# Altium footprint library LukaLIBRARY.PcbLib: 772 footprints (part 34 of 49)
Each footprint in its own frame and in the unit in brackets; x right, y up, seen from the top. Pads: shape width x height; smd on the part's side, far side on the other; paste and mask are expansions set on the pad; w line width, h text height; cw(c..) or ccw(c..) is an arc to the next point about the centre after c.
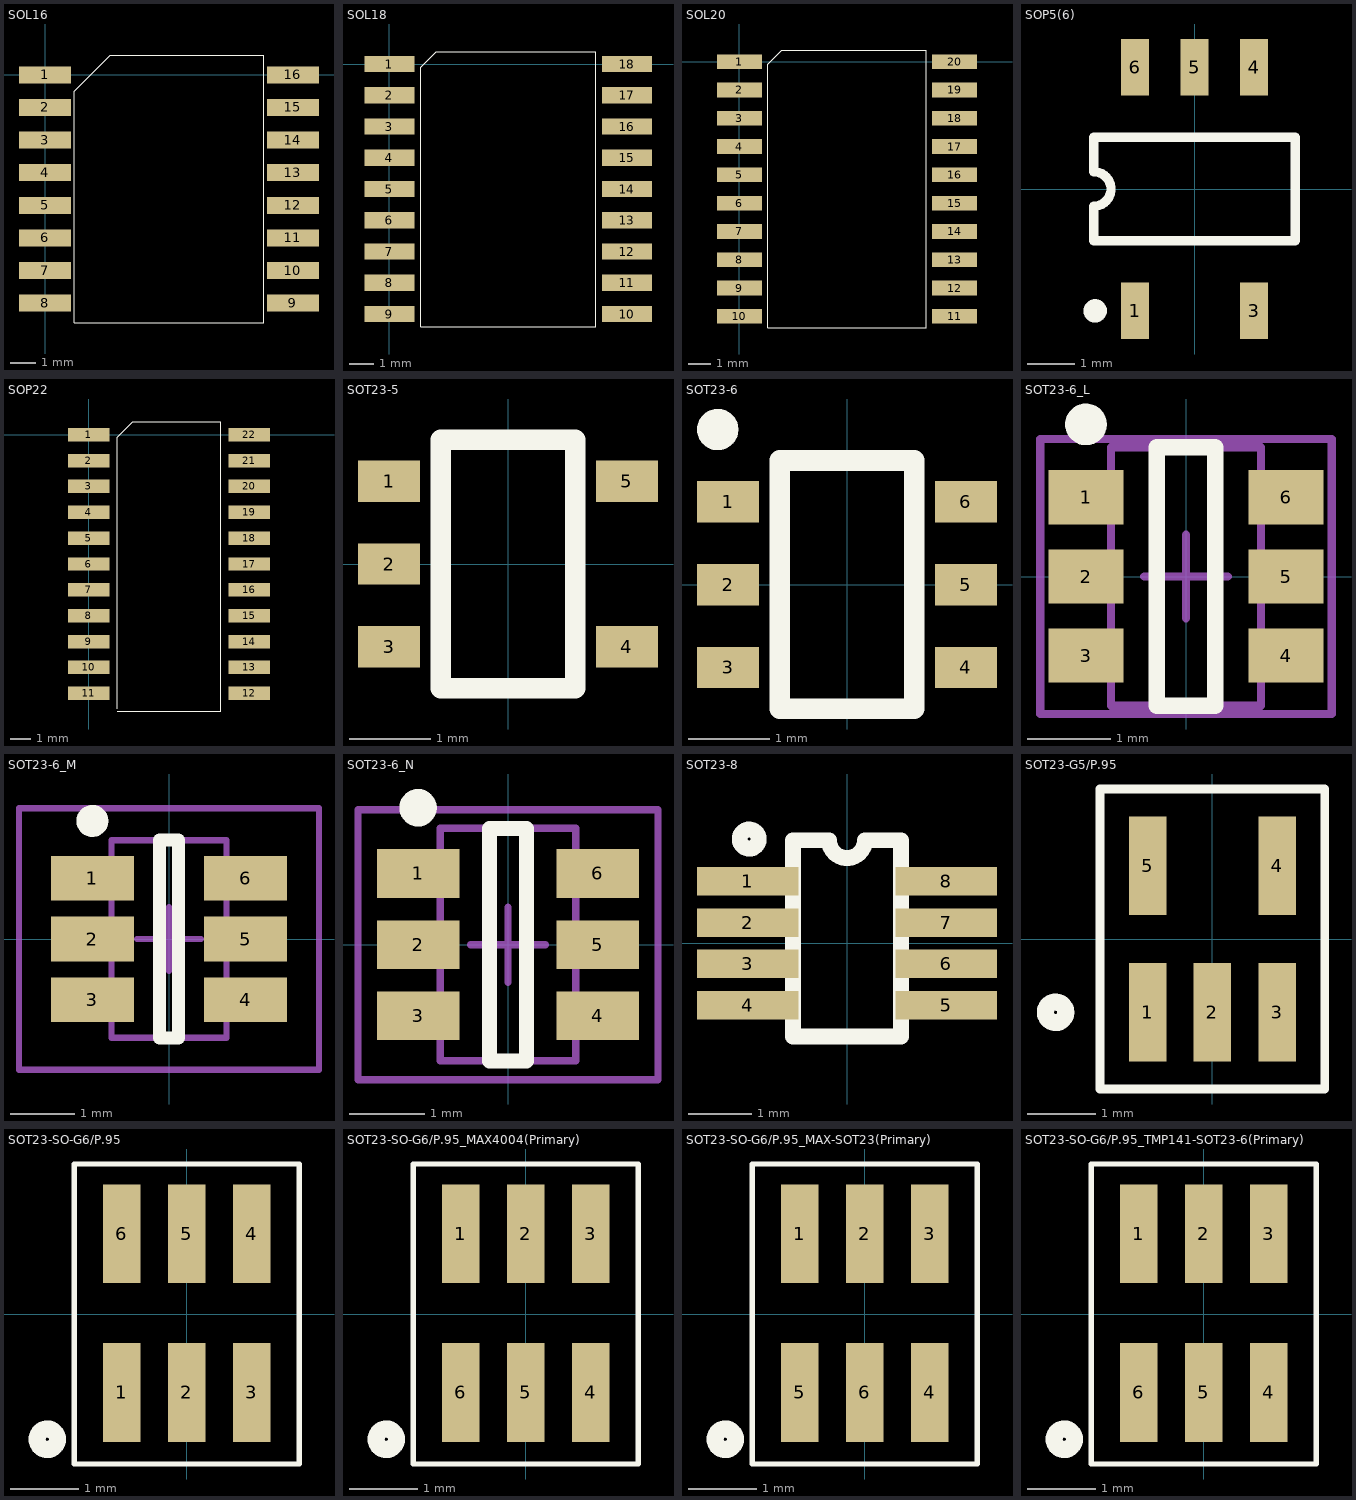
[diagram p33: the footprints below, top view; thin cyan lines are the x and y axes]

## SOL16 [mil]
pads (16):
  rect 80x26 smd mask-1000: 1(0,0) 2(0,-50) 3(0,-100) 4(0,-150) 5(0,-200) 6(0,-250) 7(0,-300) 8(0,-350) 9(380,-350) 10(380,-300) 11(380,-250) 12(380,-200) 13(380,-150) 14(380,-100) 15(380,-50) 16(380,0)
Top Overlay:
  lines w1: 45,-380 45,-25 100,30 335,30 335,-380 45,-380
Top Solder:
  region: -40,-263 40,-263 40,-237 -40,-237
  region: -40,-313 40,-313 40,-287 -40,-287
  region: -40,-363 40,-363 40,-337 -40,-337
  region: -40,-13 40,-13 40,13 -40,13
  region: -40,-63 40,-63 40,-37 -40,-37
  region: -40,-113 40,-113 40,-87 -40,-87
  region: -40,-163 40,-163 40,-137 -40,-137
  region: 340,-363 420,-363 420,-337 340,-337
  region: 340,-313 420,-313 420,-287 340,-287
  region: 340,-263 420,-263 420,-237 340,-237
  region: 340,-163 420,-163 420,-137 340,-137
  region: 340,-113 420,-113 420,-87 340,-87
  region: 340,-63 420,-63 420,-37 340,-37
  region: 340,-13 420,-13 420,13 340,13
  region: -40,-213 40,-213 40,-187 -40,-187
  region: 340,-213 420,-213 420,-187 340,-187

## SOL18 [mil]
pads (18):
  rect 80x26 smd mask-1000: 1(0,0) 2(0,-50) 3(0,-100) 4(0,-150) 5(0,-200) 6(0,-250) 7(0,-300) 8(0,-350) 9(0,-400) 10(380,-400) 11(380,-350) 12(380,-300) 13(380,-250) 14(380,-200) 15(380,-150) 16(380,-100) 17(380,-50) 18(380,0)
Top Overlay:
  lines w1: 50,-420 50,-5 75,20 330,20 330,-420 50,-420
Top Solder:
  region: -40,-263 40,-263 40,-237 -40,-237
  region: -40,-313 40,-313 40,-287 -40,-287
  region: -40,-363 40,-363 40,-337 -40,-337
  region: -40,-413 40,-413 40,-387 -40,-387
  region: -40,-13 40,-13 40,13 -40,13
  region: -40,-63 40,-63 40,-37 -40,-37
  region: -40,-113 40,-113 40,-87 -40,-87
  region: -40,-163 40,-163 40,-137 -40,-137
  region: 340,-413 420,-413 420,-387 340,-387
  region: 340,-363 420,-363 420,-337 340,-337
  region: 340,-313 420,-313 420,-287 340,-287
  region: 340,-263 420,-263 420,-237 340,-237
  region: 340,-163 420,-163 420,-137 340,-137
  region: 340,-113 420,-113 420,-87 340,-87
  region: 340,-63 420,-63 420,-37 340,-37
  region: 340,-13 420,-13 420,13 340,13
  region: -40,-213 40,-213 40,-187 -40,-187
  region: 340,-213 420,-213 420,-187 340,-187

## SOL20 [mil]
pads (20):
  rect 80x26 smd mask-1000: 1(0,0) 2(0,-50) 3(0,-100) 4(0,-150) 5(0,-200) 6(0,-250) 7(0,-300) 8(0,-350) 9(0,-400) 10(0,-450) 11(380,-450) 12(380,-400) 13(380,-350) 14(380,-300) 15(380,-250) 16(380,-200) 17(380,-150) 18(380,-100) 19(380,-50) 20(380,0)
Top Overlay:
  lines w1: 50,-470 50,-5 75,20 330,20 330,-470 50,-470
Top Solder:
  region: -40,-263 40,-263 40,-237 -40,-237
  region: -40,-313 40,-313 40,-287 -40,-287
  region: -40,-363 40,-363 40,-337 -40,-337
  region: -40,-413 40,-413 40,-387 -40,-387
  region: -40,-463 40,-463 40,-437 -40,-437
  region: -40,-13 40,-13 40,13 -40,13
  region: -40,-63 40,-63 40,-37 -40,-37
  region: -40,-113 40,-113 40,-87 -40,-87
  region: -40,-163 40,-163 40,-137 -40,-137
  region: 340,-463 420,-463 420,-437 340,-437
  region: 340,-413 420,-413 420,-387 340,-387
  region: 340,-363 420,-363 420,-337 340,-337
  region: 340,-313 420,-313 420,-287 340,-287
  region: 340,-263 420,-263 420,-237 340,-237
  region: 340,-163 420,-163 420,-137 340,-137
  region: 340,-113 420,-113 420,-87 340,-87
  region: 340,-63 420,-63 420,-37 340,-37
  region: 340,-13 420,-13 420,13 340,13
  region: -40,-213 40,-213 40,-187 -40,-187
  region: 340,-213 420,-213 420,-187 340,-187

## SOP5(6) [mm] "Small Outline; 6 Leads (1 Absent); Body Width 4.4 mm; Pitch 1.27 mm"
height 2.4
pads (5):
  rect 0.6x1.2 smd: 1(-1.27,-2.6) 3(1.27,-2.6) 4(1.27,2.6) 5(0,2.6) 6(-1.27,2.6)
Top Overlay:
  circle w0.25: c-2.12,-2.6 r0.125
  lines w0.2: -2.15,-1.1 2.15,-1.1 2.15,1.1 -2.15,1.1 -2.15,0.367 cw(c-2.15,0) -2.15,-0.367 -2.15,-1.1

## SOP22 [mil]
pads (22):
  rect 80x26 smd mask-1000: 1(0,0) 2(0,-50) 3(0,-100) 4(0,-150) 5(0,-200) 6(0,-250) 7(0,-300) 8(0,-350) 9(0,-400) 10(0,-450) 11(0,-500) 12(310,-500) 13(310,-450) 14(310,-400) 15(310,-350) 16(310,-300) 17(310,-250) 18(310,-200) 19(310,-150) 20(310,-100) 21(310,-50) 22(310,0)
Top Overlay:
  lines w1: 55,-535 255,-535 255,25 85,25 55,-5 55,-530
Top Solder:
  region: -40,-363 40,-363 40,-337 -40,-337
  region: -40,-413 40,-413 40,-387 -40,-387
  region: -40,-463 40,-463 40,-437 -40,-437
  region: 40,-487 -40,-487 -40,-513 40,-513
  region: -40,-63 40,-63 40,-37 -40,-37
  region: -40,-113 40,-113 40,-87 -40,-87
  region: -40,-163 40,-163 40,-137 -40,-137
  region: -40,-213 40,-213 40,-187 -40,-187
  region: -40,-263 40,-263 40,-237 -40,-237
  region: 350,-387 270,-387 270,-413 350,-413
  region: 350,-487 270,-487 270,-513 350,-513
  region: 350,-437 270,-437 270,-463 350,-463
  region: 270,-363 350,-363 350,-337 270,-337
  region: 270,-213 350,-213 350,-187 270,-187
  region: 270,-163 350,-163 350,-137 270,-137
  region: 270,-113 350,-113 350,-87 270,-87
  region: 270,-63 350,-63 350,-37 270,-37
  region: 270,-263 350,-263 350,-237 270,-237
  region: -40,-313 40,-313 40,-287 -40,-287
  region: -40,-13 40,-13 40,13 -40,13
  region: 270,-313 350,-313 350,-287 270,-287
  region: 270,-13 350,-13 350,13 270,13

## SOT23-5 [mil]
pads (5):
  rect 30x20 smd: 1(-57.5,40) 2(-57.5,0) 3(-57.5,-40) 4(57.5,-40) 5(57.5,40)
Top Overlay:
  lines w10: -32.5,-60 32.5,-60 32.5,60 -32.5,60 -32.5,-60

## SOT23-6 [mil]
pads (6):
  rect 30x20 smd: 1(-57.5,40) 2(-57.5,0) 3(-57.5,-40) 4(57.5,-40) 5(57.5,0) 6(57.5,40)
Top Overlay:
  circle w10: c-62.5,75 r5
  lines w10: -32.5,-60 32.5,-60 32.5,60 -32.5,60 -32.5,-60

## SOT23-6_L [mm] "SOT23, 6-Leads, Body 2.9x1.6mm, Pitch 0.95mm, Lead Span 2.7mm, IPC High Density"
height 1.45
pads (6):
  rect 0.9x0.65 smd: 1(-1.2,0.95) 2(-1.2,0) 3(-1.2,-0.95) 4(1.2,-0.95) 5(1.2,0) 6(1.2,0.95)
Top Overlay:
  circle w0.25: c-1.2,1.825 r0.125
  lines w0.2: -0.35,-1.55 -0.35,1.55 0.35,1.55 0.35,-1.55 -0.35,-1.55
Mechanical 13:
  lines w0.1: -0.9,-1.55 0.9,-1.55 0.9,1.55 -0.9,1.55 -0.9,-1.55
Mechanical 15:
  lines w0.1: -0.5,0 0.5,0 ; 0,-0.5 0,0.5 ; -1.75,-1.65 1.75,-1.65 1.75,1.65 -1.75,1.65 -1.75,-1.65
3D body: height 1.45, standoff 0, extent -0.9,-1.55 0.9,1.55

## SOT23-6_M [mm] "SOT23, 6-Leads, Body 2.9x1.6mm, Pitch 0.95mm, Lead Span 2.7mm, IPC Low Density"
height 1.45
pads (6):
  rect 1.3x0.7 smd: 1(-1.2,0.95) 2(-1.2,0) 3(-1.2,-0.95) 4(1.2,-0.95) 5(1.2,0) 6(1.2,0.95)
Top Overlay:
  circle w0.25: c-1.2,1.85 r0.125
  lines w0.2: -0.15,-1.55 0.15,-1.55 0.15,1.55 -0.15,1.55 -0.15,-1.55
Mechanical 13:
  lines w0.1: -0.9,-1.55 -0.9,1.55 0.9,1.55 0.9,-1.55 -0.9,-1.55
Mechanical 15:
  lines w0.1: -0.5,0 0.5,0 ; 0,-0.5 0,0.5 ; -2.35,-2.05 -2.35,2.05 2.35,2.05 2.35,-2.05 -2.35,-2.05
3D body: height 1.45, standoff 0, extent -0.9,-1.55 0.9,1.55

## SOT23-6_N [mm] "SOT23, 6-Leads, Body 2.9x1.6mm, Pitch 0.95mm, Lead Span 2.7mm, IPC Medium Density"
height 1.45
pads (6):
  rect 1.1x0.65 smd: 1(-1.2,0.95) 2(-1.2,0) 3(-1.2,-0.95) 4(1.2,-0.95) 5(1.2,0) 6(1.2,0.95)
Top Overlay:
  circle w0.25: c-1.2,1.825 r0.125
  lines w0.2: -0.25,-1.55 0.25,-1.55 0.25,1.55 -0.25,1.55 -0.25,-1.55
Mechanical 13:
  lines w0.1: -0.9,-1.55 -0.9,1.55 0.9,1.55 0.9,-1.55 -0.9,-1.55
Mechanical 15:
  lines w0.1: -0.5,0 0.5,0 ; 0,-0.5 0,0.5 ; -2,-1.8 -2,1.8 2,1.8 2,-1.8 -2,-1.8
3D body: height 1.45, standoff 0, extent -0.9,-1.55 0.9,1.55

## SOT23-8 [mm]
pads (8):
  rect 1.6x0.45 smd: 1(-1.567,0.975) 2(-1.567,0.325) 3(-1.567,-0.325) 4(-1.567,-0.975) 5(1.567,-0.975) 6(1.567,-0.325) 7(1.567,0.325) 8(1.567,0.975)
Top Overlay:
  circle w0.25: c-1.542,1.644 r0.15
  lines w0.25: -0.85,-1.474 0.85,-1.474 0.85,1.626 0.283,1.626 cw(c0,1.626) -0.283,1.626 -0.85,1.626 -0.85,-1.474

## SOT23-G5/P.95 [mm]
pads (5):
  rect 0.55x1.45 smd mask-25.4: 1(-0.95,-1.075) 2(0,-1.075) 3(0.95,-1.075) 4(0.95,1.075) 5(-0.95,1.075)
Top Overlay:
  circle w0.25: c-2.3,-1.075 r0.15
  lines w0.127: -1.65,-2.2 -1.65,2.2 1.65,2.2 1.65,-2.2 -1.65,-2.2
Top Solder:
  region: -1.225,0.35 -0.675,0.35 -0.675,1.8 -1.225,1.8
  region: 0.675,0.35 1.225,0.35 1.225,1.8 0.675,1.8
  region: 0.675,-1.8 1.225,-1.8 1.225,-0.35 0.675,-0.35
  region: -0.275,-1.8 0.275,-1.8 0.275,-0.35 -0.275,-0.35
  region: -1.225,-1.8 -0.675,-1.8 -0.675,-0.35 -1.225,-0.35

## SOT23-SO-G6/P.95 [mm]
pads (6):
  rect 0.55x1.45 smd: 1(-0.95,-1.151) 2(0,-1.151) 3(0.95,-1.151) 4(0.95,1.177) 5(0,1.177) 6(-0.95,1.177)
Top Overlay:
  circle w0.25: c-2.046,-1.837 r0.15
  lines w0.076: -1.65,-2.2 1.65,-2.2 1.65,2.2 -1.65,2.2 -1.65,-2.2

## SOT23-SO-G6/P.95_MAX4004(Primary) [mm]
pads (6):
  rect 0.55x1.45 smd: 1(-0.95,1.177) 2(0,1.177) 3(0.95,1.177) 4(0.95,-1.151) 5(0,-1.151) 6(-0.95,-1.151)
Top Overlay:
  circle w0.25: c-2.046,-1.837 r0.15
  lines w0.076: -1.65,-2.2 -1.65,2.2 1.65,2.2 1.65,-2.2 -1.65,-2.2

## SOT23-SO-G6/P.95_MAX-SOT23(Primary) [mm]
pads (6):
  rect 0.55x1.45 smd: 1(-0.95,1.177) 2(0,1.177) 3(0.95,1.177) 4(0.95,-1.151) 5(-0.95,-1.151) 6(0,-1.151)
Top Overlay:
  circle w0.25: c-2.046,-1.837 r0.15
  lines w0.076: -1.65,-2.2 1.65,-2.2 1.65,2.2 -1.65,2.2 -1.65,-2.2

## SOT23-SO-G6/P.95_TMP141-SOT23-6(Primary) [mm]
pads (6):
  rect 0.55x1.45 smd: 1(-0.95,1.177) 2(0,1.177) 3(0.95,1.177) 4(0.95,-1.151) 5(0,-1.151) 6(-0.95,-1.151)
Top Overlay:
  circle w0.25: c-2.046,-1.837 r0.15
  lines w0.076: -1.65,-2.2 1.65,-2.2 1.65,2.2 -1.65,2.2 -1.65,-2.2